# Altium footprint library Kintex_SDR.PcbLib: 72 footprints (part 2 of 5)
Each footprint in its own frame and in the unit in brackets; x right, y up, seen from the top. Pads: shape width x height; smd on the part's side, far side on the other; paste and mask are expansions set on the pad; w line width, h text height; cw(c..) or ccw(c..) is an arc to the next point about the centre after c.
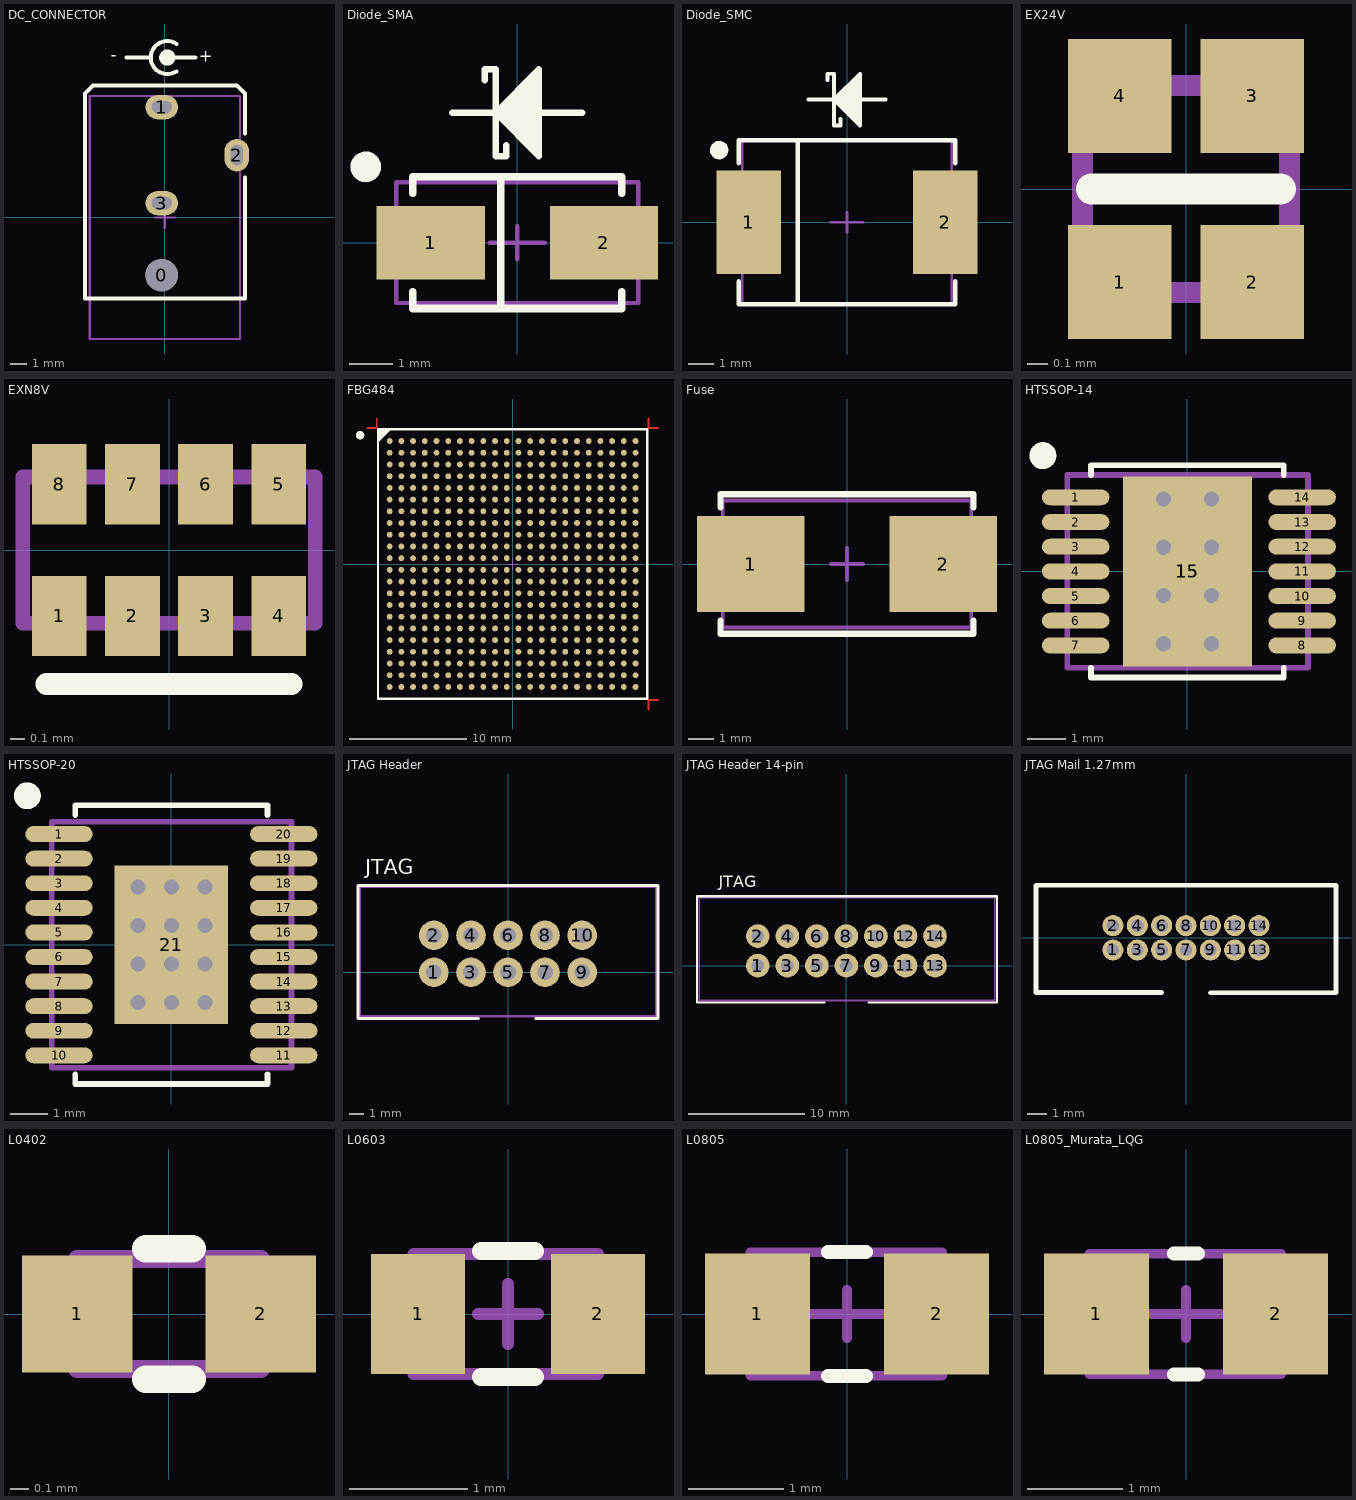
[diagram p1: the footprints below, top view; thin cyan lines are the x and y axes]

## DC_CONNECTOR [mil]
height 275.59
pads (4):
  round 80 hole 80 unplated: 0(-7.87,-141.73)
  oval 80x60 hole 30 slot 50 at 0 deg: 1(-7.87,271.65) 3(-7.87,35.43)
  oval 60x80 hole 30 slot 50 at 90 deg: 2(177.17,153.54)
Top Overlay:
  circle w20: c5.91,393.7 r9.84
  lines w10: -94.49,393.7 -35.43,393.7 ; 5.91,393.7 74.8,393.7 ; 28.42,359.93 cw(c5.91,393.7) 28.42,427.47 ; 196.85,98.43 196.85,-200 -196.85,-200 -196.85,305.12 -177.17,324.8 177.17,324.8 196.85,305.12 196.85,206.69
  text "-" at -118.11,409.45 h30
  text "+" at 118.11,409.45 h30
Mechanical 1:
  lines w5.91: -185,299.22 -185.03,299.19 ; -25,0 25,0 ; 0,-25 0,25 ; -185.03,299.19 -185.03,-299.21 185.04,-299.21 185.04,299.22 -185.03,299.22
3D body "User Library-PowerJack-2_5x5_7mm.step": height 78.74, standoff -492.13, extent -185.03,-299.21 185.04,299.22

## Diode_SMA [mm] "DO-214AC"
height 1
pads (2):
  rect 2.5x1.7 smd: 1(-2,0) 2(2,0)
Top Overlay:
  circle w0.35: c-3.5,1.75 r0.18
  region: 0.5,2 -0.5,3 0.5,4
  lines w0.15: -0.75,3.75 -0.75,4 -0.5,4 -0.5,2 -0.25,2 -0.25,2.25 ; 0.5,3 1.5,3 ; -1.5,3 -0.5,3 ; -1.5,3 -1.5,3 ; -0.5,3 0.5,4 0.5,2 -0.5,3 ; -0.5,3 -0.5,3
  lines w0.178: -2.413,-1.143 -2.413,-1.524 2.413,-1.524 2.413,-1.143 ; -2.413,1.143 -2.413,1.524 2.413,1.524 2.413,1.143 ; -0.381,-1.524 -0.381,1.524
Mechanical 1:
  lines w0.1: -0.635,0 0.635,0 ; 0,-0.381 0,0.381 ; -2.794,-1.397 -2.794,1.397 2.794,1.397 2.794,-1.397 -2.794,-1.397
3D body "User Library-SMA(DO-214AC).step": height 2.6, standoff 0.03, extent -2.75,-1.4 2.75,1.4

## Diode_SMC [mm] "DO-214AB"
height 1
pads (2):
  rect 2.5x4 smd: 1(-3.81,0) 2(3.81,0)
Top Overlay:
  circle w0.35: c-4.953,2.794 r0.18
  region: 0.5,3.75 -0.5,4.75 0.5,5.75
  lines w0.15: -0.75,5.5 -0.75,5.75 -0.5,5.75 -0.5,3.75 -0.25,3.75 -0.25,4 ; 0.5,4.75 1.5,4.75 ; -1.5,4.75 -0.5,4.75 ; -1.5,4.75 -1.5,4.75 ; -0.5,4.75 0.5,5.75 0.5,3.75 -0.5,4.75 ; -0.5,4.75 -0.5,4.75
  lines w0.178: -4.191,-2.286 -4.191,-3.175 4.191,-3.175 4.191,-2.286 ; -4.191,2.286 -4.191,3.175 4.191,3.175 4.191,2.286 ; -1.905,-3.175 -1.905,3.175
Mechanical 1:
  lines w0.1: -0.635,0 0.635,0 ; 0,-0.381 0,0.381 ; -4.064,-3.149 -4.064,3.15 4.064,3.15 4.064,-3.149 -4.064,-3.149
3D body "User Library-DO-214AB(SMC).step": height 2.64, standoff 0, extent -4.064,-3.149 4.064,3.15

## EX24V [mm] "Resistor Array 2x0402 0404"
pads (4):
  rect 0.5x0.55 smd: 1(-0.32,-0.45) 3(0.32,0.45) 4(-0.32,0.45)
  rect 0.5x0.55 smd mask+0.102: 2(0.32,-0.45)
Top Overlay:
  lines w0.15: -0.457,0 0.457,0
Mechanical 1:
  lines w0.1: -0.5,-0.5 -0.5,0.5 0.5,0.5 0.5,-0.5 -0.5,-0.5
3D body "User Library-0404_Array.step": height 0.35, standoff 0, extent -0.5,-0.5 0.5,0.5

## EXN8V [mm] "Resistor Array 4x0402 0804"
pads (8):
  rect 0.375x0.55 smd: 1(-0.75,-0.45) 2(-0.25,-0.45) 3(0.25,-0.45) 4(0.75,-0.45) 5(0.75,0.45) 6(0.25,0.45) 7(-0.25,0.45) 8(-0.75,0.45)
Top Overlay:
  lines w0.15: -0.838,-0.914 0.838,-0.914
Mechanical 1:
  lines w0.1: -1,-0.5 -1,0.5 1,0.5 1,-0.5 -1,-0.5
3D body "User Library-0804_Array.STEP": height 0.4, standoff 0, extent -1,-0.5 1,0.5

## FBG484 [mm] "BGA, 484-Leads, Body 23x23mm, Pitch 1mm"
height 2.6
pads (484):
  round 0.5 smd: A1(-10.5,10.5) A2(-9.5,10.5) A3(-8.5,10.5) A4(-7.5,10.5) A5(-6.5,10.5) A6(-5.5,10.5) A7(-4.5,10.5) A8(-3.5,10.5) A9(-2.5,10.5) A10(-1.5,10.5) A11(-0.5,10.5) A12(0.5,10.5) A13(1.5,10.5) A14(2.5,10.5) A15(3.5,10.5) A16(4.5,10.5) A17(5.5,10.5) A18(6.5,10.5) A19(7.5,10.5) A20(8.5,10.5) A21(9.5,10.5) A22(10.5,10.5) AA1(-10.5,-9.5) AA2(-9.5,-9.5) AA3(-8.5,-9.5) AA4(-7.5,-9.5) AA5(-6.5,-9.5) AA6(-5.5,-9.5) AA7(-4.5,-9.5) AA8(-3.5,-9.5) AA9(-2.5,-9.5) AA10(-1.5,-9.5) AA11(-0.5,-9.5) AA12(0.5,-9.5) AA13(1.5,-9.5) AA14(2.5,-9.5) AA15(3.5,-9.5) AA16(4.5,-9.5) AA17(5.5,-9.5) AA18(6.5,-9.5) AA19(7.5,-9.5) AA20(8.5,-9.5) AA21(9.5,-9.5) AA22(10.5,-9.5) AB1(-10.5,-10.5) AB2(-9.5,-10.5) AB3(-8.5,-10.5) AB4(-7.5,-10.5) AB5(-6.5,-10.5) AB6(-5.5,-10.5) AB7(-4.5,-10.5) AB8(-3.5,-10.5) AB9(-2.5,-10.5) AB10(-1.5,-10.5) AB11(-0.5,-10.5) AB12(0.5,-10.5) AB13(1.5,-10.5) AB14(2.5,-10.5) AB15(3.5,-10.5) AB16(4.5,-10.5) AB17(5.5,-10.5) AB18(6.5,-10.5) AB19(7.5,-10.5) AB20(8.5,-10.5) AB21(9.5,-10.5) AB22(10.5,-10.5) B1(-10.5,9.5) B2(-9.5,9.5) B3(-8.5,9.5) B4(-7.5,9.5) B5(-6.5,9.5) B6(-5.5,9.5) B7(-4.5,9.5) B8(-3.5,9.5) B9(-2.5,9.5) B10(-1.5,9.5) B11(-0.5,9.5) B12(0.5,9.5) B13(1.5,9.5) B14(2.5,9.5) B15(3.5,9.5) B16(4.5,9.5) B17(5.5,9.5) B18(6.5,9.5) B19(7.5,9.5) B20(8.5,9.5) B21(9.5,9.5) B22(10.5,9.5) C1(-10.5,8.5) C2(-9.5,8.5) C3(-8.5,8.5) C4(-7.5,8.5) C5(-6.5,8.5) C6(-5.5,8.5) C7(-4.5,8.5) C8(-3.5,8.5) C9(-2.5,8.5) C10(-1.5,8.5) C11(-0.5,8.5) C12(0.5,8.5) C13(1.5,8.5) C14(2.5,8.5) C15(3.5,8.5) C16(4.5,8.5) C17(5.5,8.5) C18(6.5,8.5) C19(7.5,8.5) C20(8.5,8.5) C21(9.5,8.5) C22(10.5,8.5) D1(-10.5,7.5) D2(-9.5,7.5) D3(-8.5,7.5) D4(-7.5,7.5) D5(-6.5,7.5) D6(-5.5,7.5) D7(-4.5,7.5) D8(-3.5,7.5) D9(-2.5,7.5) D10(-1.5,7.5) D11(-0.5,7.5) D12(0.5,7.5) D13(1.5,7.5) D14(2.5,7.5) D15(3.5,7.5) D16(4.5,7.5) D17(5.5,7.5) D18(6.5,7.5) D19(7.5,7.5) D20(8.5,7.5) D21(9.5,7.5) D22(10.5,7.5) E1(-10.5,6.5) E2(-9.5,6.5) E3(-8.5,6.5) E4(-7.5,6.5) E5(-6.5,6.5) E6(-5.5,6.5) E7(-4.5,6.5) E8(-3.5,6.5) E9(-2.5,6.5) E10(-1.5,6.5) E11(-0.5,6.5) E12(0.5,6.5) E13(1.5,6.5) E14(2.5,6.5) E15(3.5,6.5) E16(4.5,6.5) E17(5.5,6.5) E18(6.5,6.5) E19(7.5,6.5) E20(8.5,6.5) E21(9.5,6.5) E22(10.5,6.5) F1(-10.5,5.5) F2(-9.5,5.5) F3(-8.5,5.5) F4(-7.5,5.5) F5(-6.5,5.5) F6(-5.5,5.5) F7(-4.5,5.5) F8(-3.5,5.5) F9(-2.5,5.5) F10(-1.5,5.5) F11(-0.5,5.5) F12(0.5,5.5) F13(1.5,5.5) F14(2.5,5.5) F15(3.5,5.5) F16(4.5,5.5) F17(5.5,5.5) F18(6.5,5.5) F19(7.5,5.5) F20(8.5,5.5) F21(9.5,5.5) F22(10.5,5.5) G1(-10.5,4.5) G2(-9.5,4.5) G3(-8.5,4.5) G4(-7.5,4.5) G5(-6.5,4.5) G6(-5.5,4.5) G7(-4.5,4.5) G8(-3.5,4.5) G9(-2.5,4.5) G10(-1.5,4.5) G11(-0.5,4.5) G12(0.5,4.5) G13(1.5,4.5) G14(2.5,4.5) G15(3.5,4.5) G16(4.5,4.5) G17(5.5,4.5) G18(6.5,4.5) G19(7.5,4.5) G20(8.5,4.5) G21(9.5,4.5) G22(10.5,4.5) H1(-10.5,3.5) H2(-9.5,3.5) H3(-8.5,3.5) H4(-7.5,3.5) H5(-6.5,3.5) H6(-5.5,3.5) H7(-4.5,3.5) H8(-3.5,3.5) H9(-2.5,3.5) H10(-1.5,3.5) H11(-0.5,3.5) H12(0.5,3.5) H13(1.5,3.5) H14(2.5,3.5) H15(3.5,3.5) H16(4.5,3.5) H17(5.5,3.5) H18(6.5,3.5) H19(7.5,3.5) H20(8.5,3.5) H21(9.5,3.5) H22(10.5,3.5) J1(-10.5,2.5) J2(-9.5,2.5) J3(-8.5,2.5) J4(-7.5,2.5) J5(-6.5,2.5) J6(-5.5,2.5) J7(-4.5,2.5) J8(-3.5,2.5) J9(-2.5,2.5) J10(-1.5,2.5) J11(-0.5,2.5) J12(0.5,2.5) J13(1.5,2.5) J14(2.5,2.5) J15(3.5,2.5) J16(4.5,2.5) J17(5.5,2.5) J18(6.5,2.5) J19(7.5,2.5) J20(8.5,2.5) J21(9.5,2.5) J22(10.5,2.5) K1(-10.5,1.5) K2(-9.5,1.5) K3(-8.5,1.5) K4(-7.5,1.5) K5(-6.5,1.5) K6(-5.5,1.5) K7(-4.5,1.5) K8(-3.5,1.5) K9(-2.5,1.5) K10(-1.5,1.5) K11(-0.5,1.5) K12(0.5,1.5) K13(1.5,1.5) K14(2.5,1.5) K15(3.5,1.5) K16(4.5,1.5) K17(5.5,1.5) K18(6.5,1.5) K19(7.5,1.5) K20(8.5,1.5) K21(9.5,1.5) K22(10.5,1.5) L1(-10.5,0.5) L2(-9.5,0.5) L3(-8.5,0.5) L4(-7.5,0.5) L5(-6.5,0.5) L6(-5.5,0.5) L7(-4.5,0.5) L8(-3.5,0.5) L9(-2.5,0.5) L10(-1.5,0.5) L11(-0.5,0.5) L12(0.5,0.5) L13(1.5,0.5) L14(2.5,0.5) L15(3.5,0.5) L16(4.5,0.5) L17(5.5,0.5) L18(6.5,0.5) L19(7.5,0.5) L20(8.5,0.5) L21(9.5,0.5) L22(10.5,0.5) M1(-10.5,-0.5) M2(-9.5,-0.5) M3(-8.5,-0.5) M4(-7.5,-0.5) M5(-6.5,-0.5) M6(-5.5,-0.5) M7(-4.5,-0.5) M8(-3.5,-0.5) M9(-2.5,-0.5) M10(-1.5,-0.5) M11(-0.5,-0.5) M12(0.5,-0.5) M13(1.5,-0.5) M14(2.5,-0.5) M15(3.5,-0.5) M16(4.5,-0.5) M17(5.5,-0.5) M18(6.5,-0.5) M19(7.5,-0.5) M20(8.5,-0.5) M21(9.5,-0.5) M22(10.5,-0.5) N1(-10.5,-1.5) N2(-9.5,-1.5) N3(-8.5,-1.5) N4(-7.5,-1.5) N5(-6.5,-1.5) N6(-5.5,-1.5) N7(-4.5,-1.5) N8(-3.5,-1.5) N9(-2.5,-1.5) N10(-1.5,-1.5) N11(-0.5,-1.5) N12(0.5,-1.5) N13(1.5,-1.5) N14(2.5,-1.5) N15(3.5,-1.5) N16(4.5,-1.5) N17(5.5,-1.5) N18(6.5,-1.5) N19(7.5,-1.5) N20(8.5,-1.5) N21(9.5,-1.5) N22(10.5,-1.5) P1(-10.5,-2.5) P2(-9.5,-2.5) P3(-8.5,-2.5) P4(-7.5,-2.5) P5(-6.5,-2.5) P6(-5.5,-2.5) P7(-4.5,-2.5) P8(-3.5,-2.5) P9(-2.5,-2.5) P10(-1.5,-2.5) P11(-0.5,-2.5) P12(0.5,-2.5) P13(1.5,-2.5) P14(2.5,-2.5) P15(3.5,-2.5) P16(4.5,-2.5) P17(5.5,-2.5) P18(6.5,-2.5) P19(7.5,-2.5) P20(8.5,-2.5) P21(9.5,-2.5) P22(10.5,-2.5) R1(-10.5,-3.5) R2(-9.5,-3.5) R3(-8.5,-3.5) R4(-7.5,-3.5) R5(-6.5,-3.5) R6(-5.5,-3.5) R7(-4.5,-3.5) R8(-3.5,-3.5) R9(-2.5,-3.5) R10(-1.5,-3.5) R11(-0.5,-3.5) R12(0.5,-3.5) R13(1.5,-3.5) R14(2.5,-3.5) R15(3.5,-3.5) R16(4.5,-3.5) R17(5.5,-3.5) R18(6.5,-3.5) R19(7.5,-3.5) R20(8.5,-3.5) R21(9.5,-3.5) R22(10.5,-3.5) T1(-10.5,-4.5) T2(-9.5,-4.5) T3(-8.5,-4.5) T4(-7.5,-4.5) T5(-6.5,-4.5) T6(-5.5,-4.5) T7(-4.5,-4.5) T8(-3.5,-4.5) T9(-2.5,-4.5) T10(-1.5,-4.5) T11(-0.5,-4.5) T12(0.5,-4.5) T13(1.5,-4.5) T14(2.5,-4.5) T15(3.5,-4.5) T16(4.5,-4.5) T17(5.5,-4.5) T18(6.5,-4.5) T19(7.5,-4.5) T20(8.5,-4.5) T21(9.5,-4.5) T22(10.5,-4.5) U1(-10.5,-5.5) U2(-9.5,-5.5) U3(-8.5,-5.5) U4(-7.5,-5.5) U5(-6.5,-5.5) U6(-5.5,-5.5) U7(-4.5,-5.5) U8(-3.5,-5.5) U9(-2.5,-5.5) U10(-1.5,-5.5) U11(-0.5,-5.5) U12(0.5,-5.5) U13(1.5,-5.5) U14(2.5,-5.5) U15(3.5,-5.5) U16(4.5,-5.5) U17(5.5,-5.5) U18(6.5,-5.5) U19(7.5,-5.5) U20(8.5,-5.5) U21(9.5,-5.5) U22(10.5,-5.5) V1(-10.5,-6.5) V2(-9.5,-6.5) V3(-8.5,-6.5) V4(-7.5,-6.5) V5(-6.5,-6.5) V6(-5.5,-6.5) V7(-4.5,-6.5) V8(-3.5,-6.5) V9(-2.5,-6.5) V10(-1.5,-6.5) V11(-0.5,-6.5) V12(0.5,-6.5) V13(1.5,-6.5) V14(2.5,-6.5) V15(3.5,-6.5) V16(4.5,-6.5) V17(5.5,-6.5) V18(6.5,-6.5) V19(7.5,-6.5) V20(8.5,-6.5) V21(9.5,-6.5) V22(10.5,-6.5) W1(-10.5,-7.5) W2(-9.5,-7.5) W3(-8.5,-7.5) W4(-7.5,-7.5) W5(-6.5,-7.5) W6(-5.5,-7.5) W7(-4.5,-7.5) W8(-3.5,-7.5) W9(-2.5,-7.5) W10(-1.5,-7.5) W11(-0.5,-7.5) W12(0.5,-7.5) W13(1.5,-7.5) W14(2.5,-7.5) W15(3.5,-7.5) W16(4.5,-7.5) W17(5.5,-7.5) W18(6.5,-7.5) W19(7.5,-7.5) W20(8.5,-7.5) W21(9.5,-7.5) W22(10.5,-7.5) Y1(-10.5,-8.5) Y2(-9.5,-8.5) Y3(-8.5,-8.5) Y4(-7.5,-8.5) Y5(-6.5,-8.5) Y6(-5.5,-8.5) Y7(-4.5,-8.5) Y8(-3.5,-8.5) Y9(-2.5,-8.5) Y10(-1.5,-8.5) Y11(-0.5,-8.5) Y12(0.5,-8.5) Y13(1.5,-8.5) Y14(2.5,-8.5) Y15(3.5,-8.5) Y16(4.5,-8.5) Y17(5.5,-8.5) Y18(6.5,-8.5) Y19(7.5,-8.5) Y20(8.5,-8.5) Y21(9.5,-8.5) Y22(10.5,-8.5)
Top Layer:
  lines w0.15: -12.419,11.606 -11.606,11.606 -11.606,12.419 ; 11.606,-12.419 11.606,-11.606 12.419,-11.606 ; 11.606,12.419 11.606,11.606 12.419,11.606
Top Overlay:
  circle w0.35: c-13.025,11 r0.18
  region: -10.5,11.5 -11.5,10.5 -11.5,11.5
  lines w0.2: -11.5,10.5 -10.5,11.5 ; -11.5,-11.5 11.5,-11.5 11.5,11.5 -11.5,11.5 -11.5,-11.5
Mechanical 1:
  lines w0.1: -0.5,0 0.5,0 ; 0,-0.5 0,0.5 ; -11.5,-11.5 11.5,-11.5 11.5,11.5 -11.5,11.5 -11.5,-11.5
3D body "User Library-FBG484C.STEP": height 2.12, standoff -0.09, extent -11.5,-11.5 11.5,11.5

## Fuse [mm]
height 1
pads (2):
  rect 4.24x3.81 smd: 1(-3.81,0) 2(3.81,0)
Top Overlay:
  lines w0.254: -5,-2.25 -5,-2.75 5,-2.75 5,-2.25 ; -5,2.25 -5,2.75 5,2.75 5,2.25
Mechanical 1:
  lines w0.15: -0.635,0 0.635,0 ; 0,-0.635 0,0.635 ; -4.915,-2.515 4.915,-2.515 4.915,2.515 -4.915,2.515 -4.915,-2.515
3D body "User Library-OMNI-BLOK littelfuse.step": height 3.81, standoff 0, extent -4.915,-2.515 4.915,2.515

## HTSSOP-14 [mm] "4.40 mm ? 5.00 mm 14-Pin HTSSOP"
height 1.2
pads (16):
  oval 1.78x0.42 smd: 1(-2.946,1.95) 2(-2.946,1.3) 3(-2.946,0.65) 4(-2.946,0) 5(-2.946,-0.65) 6(-2.946,-1.3) 7(-2.946,-1.95) 8(3.023,-1.95) 9(3.023,-1.3) 10(3.023,-0.65) 11(3.023,0) 12(3.023,0.65) 13(3.023,1.3) 14(3.023,1.95)
  rect 3.4x5 all layers, no hole: 15(0,0)
  rect 2.46x2.31 on Top Solder: 15(0,0)
via -0.635,0.635 diameter 0.7 hole 0.4
via -0.635,-0.635 diameter 0.7 hole 0.4
via 0.635,0.635 diameter 0.7 hole 0.4
via 0.635,-0.635 diameter 0.7 hole 0.4
via 0.635,-1.905 diameter 0.7 hole 0.4
via -0.635,-1.905 diameter 0.7 hole 0.4
via -0.635,1.905 diameter 0.7 hole 0.4
via 0.635,1.905 diameter 0.7 hole 0.4
Top Overlay:
  circle w0.35: c-3.81,3.048 r0.18
  lines w0.15: -2.54,-2.54 -2.54,-2.794 2.54,-2.794 2.54,-2.54 ; -2.54,2.54 -2.54,2.794 2.54,2.794 2.54,2.54
Top Paste:
  region: -0.127,1.016 -1.016,1.016 -1.016,0.127 -0.127,0.127
  rectangle: 0.127,0.127 1.016,1.016
  rectangle: 0.127,-1.016 1.016,-0.127
  region: -0.127,-0.127 -1.016,-0.127 -1.016,-1.016 -0.127,-1.016
Mechanical 1:
  lines w0.15: -0.508,0 0.508,0 ; 0,-0.508 0,0.508 ; -3.163,-2.54 3.175,-2.54 3.175,2.54 -3.163,2.54 -3.163,-2.54
3D body "HTSSOP-14.step": height 1.2, standoff 0, extent -3.2,-2.55 3.2,2.55

## HTSSOP-20 [mm]
height 3
pads (21):
  oval 1.78x0.42 smd: 1(-2.97,2.925) 2(-2.97,2.275) 3(-2.97,1.625) 4(-2.97,0.975) 5(-2.97,0.325) 6(-2.97,-0.325) 7(-2.97,-0.975) 8(-2.97,-1.625) 9(-2.97,-2.275) 10(-2.97,-2.925) 11(2.97,-2.925) 12(2.97,-2.275) 13(2.97,-1.625) 14(2.97,-0.975) 15(2.97,-0.325) 16(2.97,0.325) 17(2.97,0.975) 18(2.97,1.625) 19(2.97,2.275) 20(2.97,2.925)
  rect 3x4.2 all layers, no hole: 21(0,0)
via 0,0.508 diameter 0.7 hole 0.4
via 0.889,0.508 diameter 0.7 hole 0.4
via -0.889,0.508 diameter 0.7 hole 0.4
via 0.889,1.524 diameter 0.7 hole 0.4
via 0,1.524 diameter 0.7 hole 0.4
via -0.889,1.524 diameter 0.7 hole 0.4
via -0.889,-1.524 diameter 0.7 hole 0.4
via 0,-1.524 diameter 0.7 hole 0.4
via 0.889,-1.524 diameter 0.7 hole 0.4
via -0.889,-0.508 diameter 0.7 hole 0.4
via 0.889,-0.508 diameter 0.7 hole 0.4
via 0,-0.508 diameter 0.7 hole 0.4
Top Overlay:
  circle w0.35: c-3.81,3.937 r0.18
  lines w0.15: -2.54,-3.429 -2.54,-3.683 2.54,-3.683 2.54,-3.429 ; -2.54,3.429 -2.54,3.683 2.54,3.683 2.54,3.429
Top Paste:
  region: -0.127,0.508 -1.27,0.508 -1.27,-0.508 -0.127,-0.508
  rectangle: 0.127,-0.508 1.27,0.508
  rectangle: 0.127,0.762 1.27,1.778
  region: -0.127,1.778 -1.27,1.778 -1.27,0.762 -0.127,0.762
  region: -0.127,-0.762 -1.27,-0.762 -1.27,-1.778 -0.127,-1.778
  rectangle: 0.127,-1.778 1.27,-0.762
Mechanical 1:
  lines w0.15: -0.508,0 0.508,0 ; 0,-0.508 0,0.508 ; -3.163,-3.25 -3.163,3.25 3.175,3.25 3.175,-3.25 -3.163,-3.25
3D body "User Library-HTSSOP20.step": height 1, standoff -0.01, extent -3.207,-3.249 3.207,3.251

## JTAG Header [mil] "10-pin 2.54mm pitch PCB Header"
height 196.85
pads (10):
  round 80 hole 42: 1(-200,0) 2(-200,100) 3(-100,0) 4(-100,100) 5(0,0) 6(0,100) 7(100,0) 8(100,100) 9(200,0) 10(200,100)
Top Overlay:
  lines w7.87: -80,-125 -405,-125 -405,235 405,235 405,-125 75,-125
  text "JTAG" at -385,265 h40
Mechanical 1:
  lines w5.91: -20,0 20,0 ; 0,-20 0,20 ; -399.61,-118.42 -399.61,230 399.61,230 399.61,-118.42 -399.61,-118.42
3D body "User Library-IDC Socket Male 10pin Straight THT Goldplated 2_54mm.step": height 379.13, standoff -109.06, extent -399.61,-118.42 399.61,230

## JTAG Header 14-pin [mil] "14-pin 2.54mm pitch PCB Header"
height 196.85
pads (14):
  round 80 hole 42: 1(-300,0) 2(-300,100) 3(-200,0) 4(-200,100) 5(-100,0) 6(-100,100) 7(0,0) 8(0,100) 9(100,0) 10(100,100) 11(200,0) 12(200,100) 13(300,0) 14(300,100)
Top Overlay:
  lines w7.87: -74.8,-125 -505.9,-125 -505.9,235 509.85,235 509.85,-125 74.8,-125
  text "JTAG" at -431.85,265 h40
Mechanical 1:
  lines w5.91: -19.8,0 20.2,0 ; 0.2,-20 0.2,20 ; -498.03,-118.42 -498.03,230 501.97,230 501.97,-118.42 -498.03,-118.42
3D body "User Library-IDC Socket Male 14pin Straight THT Goldplated 2_54mm.step": height 359.45, standoff -128.74, extent -500,-120.28 499.21,228.15

## JTAG Mail 1.27mm [mm]
height 2.9
pads (14):
  round 1.1 hole 0.65: 1(-3.81,-0.635) 2(-3.81,0.635) 3(-2.54,-0.635) 4(-2.54,0.635) 5(-1.27,-0.635) 6(-1.27,0.635) 7(0,-0.635) 8(0,0.635) 9(1.27,-0.635) 10(1.27,0.635) 11(2.54,-0.635) 12(2.54,0.635) 13(3.81,-0.635) 14(3.81,0.635)
Top Overlay:
  lines w0.254: -1.27,-2.855 -7.823,-2.855 -7.823,2.743 7.823,2.743 7.823,-2.866 1.27,-2.866
3D body "User Library-CONB127P-2R-20W_TH.step": height 5.4, standoff -2.1, extent -7.595,-2.65 7.595,2.55

## L0402 [mm] "Chip Capacitor, Body 1.0x0.5mm, IPC High Density"
height 1.3
pads (2):
  rect 0.6x0.635 smd: 1(-0.5,0) 2(0.5,0)
Top Overlay:
  lines w0.15: -0.127,-0.356 0.127,-0.356 ; -0.127,0.356 0.127,0.356
Mechanical 1:
  lines w0.1: -0.5,-0.3 0.5,-0.3 0.5,0.3 -0.5,0.3 -0.5,-0.3
3D body "User Library-Chip Inductor_0402.step": height 0.48, standoff -0.02, extent -0.5,-0.3 0.5,0.3

## L0603 [mil] "Chip Capacitor, Body 1.6x0.8mm, IPC High Density"
height 51.18
pads (2):
  rect 31.5x40 smd: 1(-30,0) 2(30,0)
Top Overlay:
  lines w5.91: -9,-21 9,-21 ; -9,21 9,21
Mechanical 1:
  lines w3.94: -10,0 10,0 ; 0,-10 0,10 ; -31.5,-20 -31.5,20 30,20 30,-20 -31.5,-20
3D body "User Library-Chip Inductor_0603.step": height 30.75, standoff -0.75, extent -31.5,-18.7 31.5,18.7

## L0805 [mm] "Chip Capacitor, Body 2.0x1.3mm, IPC High Density"
height 1.4
pads (2):
  rect 1.1x1.27 smd: 1(-0.94,0) 2(0.94,0)
Top Overlay:
  lines w0.15: -0.2,-0.65 0.2,-0.65 ; -0.2,0.65 0.2,0.65
Mechanical 1:
  lines w0.1: -0.5,0 0.5,0 ; 0,-0.254 0,0.254 ; -1.016,-0.65 -1.016,0.65 1,0.65 1,-0.65 -1.016,-0.65
3D body "User Library-Chip Inductor_0805.step": height 0.94, standoff -0.01, extent -1,-0.6 1,0.6

## L0805_Murata_LQG [mm]
height 1.4
pads (2):
  rect 1.1x1.27 smd: 1(-0.94,0) 2(0.94,0)
Top Overlay:
  lines w0.15: -0.127,-0.635 0.127,-0.635 ; -0.127,0.635 0.127,0.635
Mechanical 1:
  lines w0.1: -0.381,0 0.381,0 ; 0,-0.254 0,0.254 ; -1.016,-0.635 -1.016,0.635 1,0.635 1,-0.635 -1.016,-0.635
3D body "User Library-ind_0805.step": height 0.95, standoff 0, extent -1,-0.6 1,0.6